# Altium footprint library SomoPowerPackControl.PcbLib: 145 footprints (part 9 of 10)
Each footprint in its own frame and in the unit in brackets; x right, y up, seen from the top. Pads: shape width x height; smd on the part's side, far side on the other; paste and mask are expansions set on the pad; w line width, h text height; cw(c..) or ccw(c..) is an arc to the next point about the centre after c.
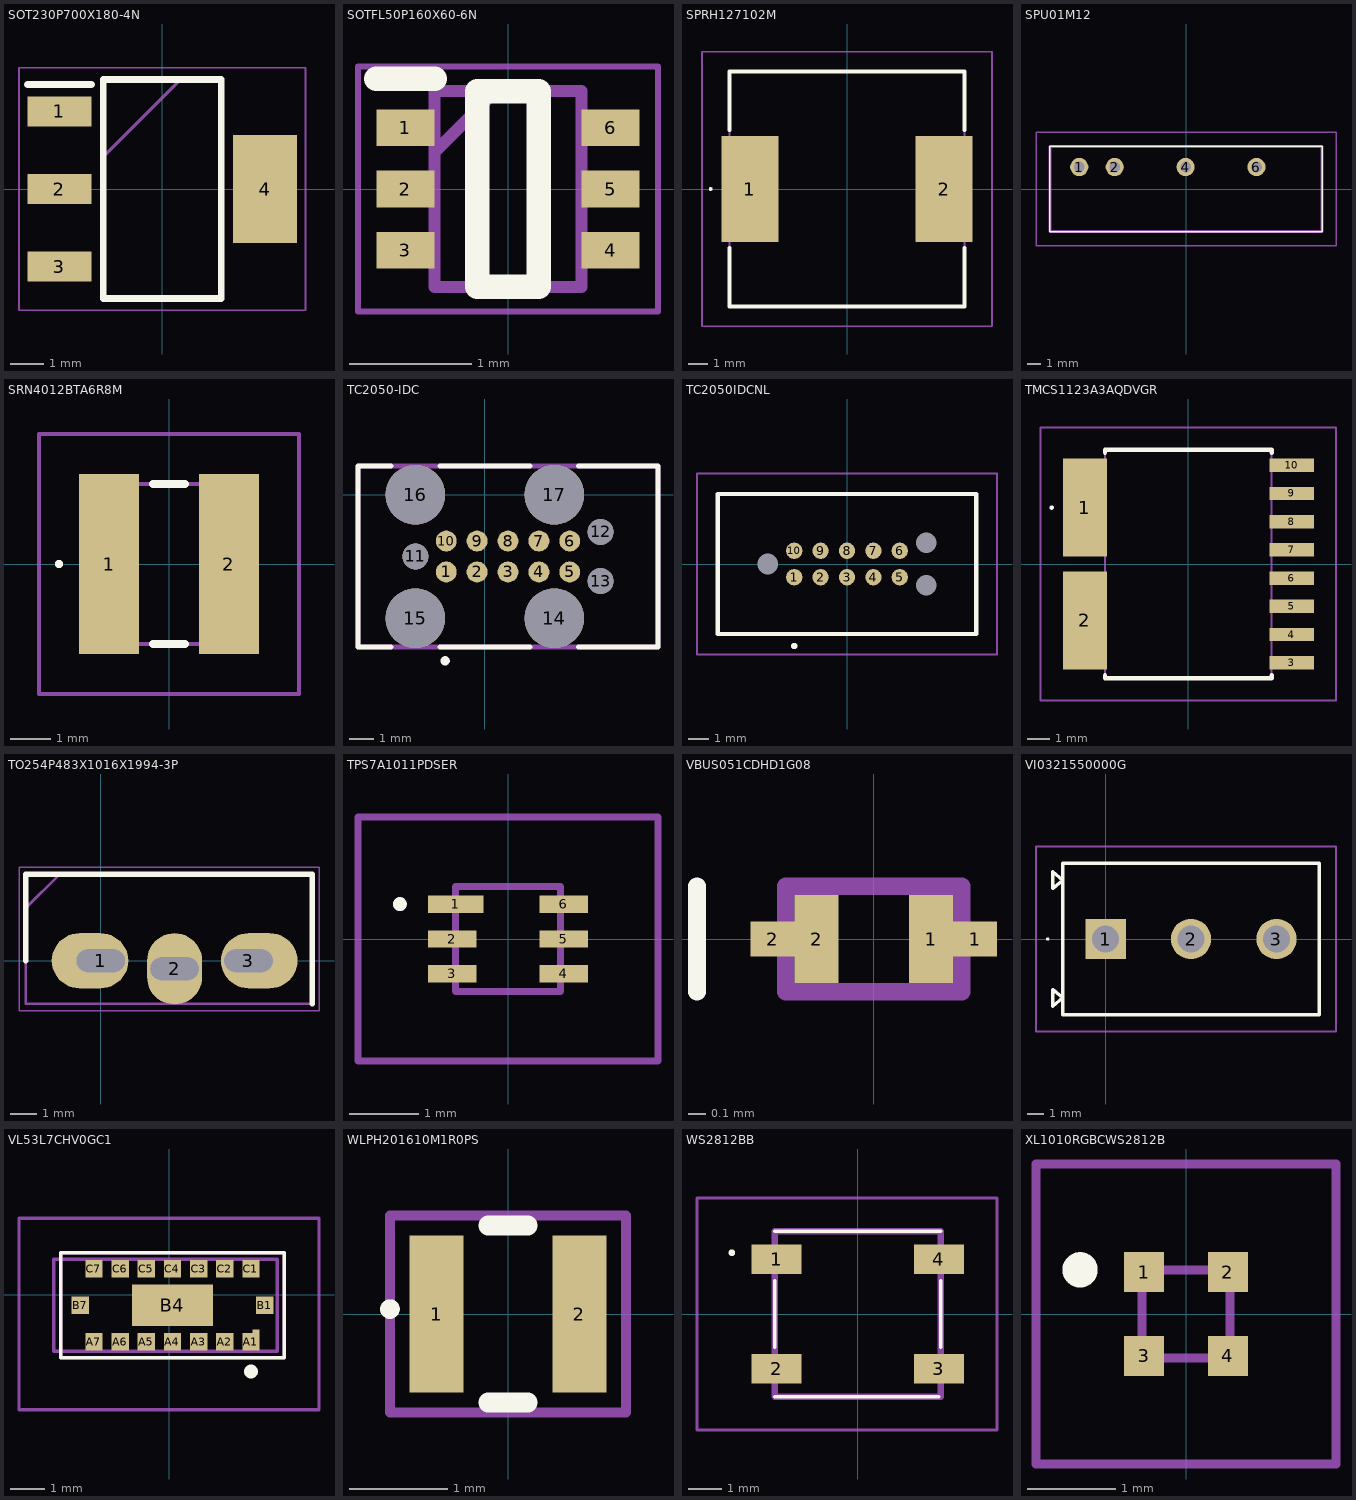
[diagram p8: the footprints below, top view; thin cyan lines are the x and y axes]

## SOT230P700X180-4N [mm]
pads (4):
  rect 1.9x0.9 smd: 1(-3.05,2.3) 2(-3.05,0) 3(-3.05,-2.3)
  rect 1.9x3.2 smd: 4(3.05,0)
Top Overlay:
  lines w0.2: -4,3.1 -2.1,3.1 ; -1.75,-3.25 -1.75,3.25 1.75,3.25 1.75,-3.25 -1.75,-3.25
Mechanical 13:
  lines w0.1: -1.75,0.95 0.55,3.25 ; -1.75,-3.25 -1.75,3.25 1.75,3.25 1.75,-3.25 -1.75,-3.25
Mechanical 15:
  lines w0.05: -4.25,-3.6 -4.25,3.6 4.25,3.6 4.25,-3.6 -4.25,-3.6
3D body "AP2114HA-3.3TRG1.stp": height 1.8, standoff 0, extent -3.5,-3.25 3.5,3.25

## SOTFL50P160X60-6N [mm]
pads (6):
  rect 0.475x0.3 smd: 1(-0.838,0.5) 2(-0.838,0) 3(-0.838,-0.5) 4(0.838,-0.5) 5(0.838,0) 6(0.838,0.5)
Top Overlay:
  lines w0.2: -1.075,0.9 -0.6,0.9 ; -0.25,-0.8 0.25,-0.8 0.25,0.8 -0.25,0.8 -0.25,-0.8
Mechanical 13:
  lines w0.1: -0.6,0.3 -0.1,0.8 ; -0.6,-0.8 0.6,-0.8 0.6,0.8 -0.6,0.8 -0.6,-0.8
Mechanical 15:
  lines w0.05: -1.225,-1 1.225,-1 1.225,1 -1.225,1 -1.225,-1
3D body "2N7002BKV,115.stp": height 0.57, standoff 0, extent -0.802,-0.793 0.798,0.807

## SPRH127102M [mm]
pads (2):
  rect 2.9x5.4 smd: 1(-4.95,0) 2(4.95,0)
Top Overlay:
  lines w0.1: -7,0 ccw(c-6.95,0) -6.9,0 ccw(c-6.95,0) -7,0
  lines w0.2: -6,-3 -6,-6 6,-6 6,-3 ; -6,3 -6,6 6,6 6,3
Mechanical 13:
  lines w0.1: -6,-6 6,-6 6,6 -6,6 -6,-6
Mechanical 15:
  lines w0.1: -7.4,-7 7.4,-7 7.4,7 -7.4,7 -7.4,-7
3D body "SPRH127-102M.stp": height 8.15, standoff 0, extent -6.11,-6 6.11,6

## SPU01M12 [mm]
pads (4):
  round 1.303 hole 0.76: 1(-7.65,1.575) 2(-5.11,1.575) 4(-0.03,1.575) 6(5.05,1.575)
Top Overlay:
  lines w0.1: -9.75,-3.05 9.75,-3.05 9.75,3.05 -9.75,3.05 -9.75,-3.05
Mechanical 13:
  lines w0.2: -9.75,-3.05 9.75,-3.05 9.75,3.05 -9.75,3.05 -9.75,-3.05
Mechanical 15:
  lines w0.1: -10.75,-4.05 10.75,-4.05 10.75,4.05 -10.75,4.05 -10.75,-4.05
3D body "SPU01M-12.stp": height 10.1, standoff -5, extent -9.75,-3.05 9.75,3.05

## SRN4012BTA6R8M [mm]
pads (2):
  rect 1.5x4.5 smd: 1(-1.5,0) 2(1.5,0)
Top Overlay:
  lines w0.1: -2.8,0 ccw(c-2.75,0) -2.7,0 ccw(c-2.75,0) -2.8,0
  lines w0.2: -0.4,-2 0.4,-2 ; -0.4,2 0.4,2
Mechanical 13:
  lines w0.1: -2,-2 2,-2 2,2 -2,2 -2,-2
Mechanical 15:
  lines w0.1: -3.25,-3.25 3.25,-3.25 3.25,3.25 -3.25,3.25 -3.25,-3.25

## TC2050-IDC [mil]
pads (17):
  round 34 smd: 1(-62.5,-125) 2(-12.5,-125) 3(37.5,-125) 4(87.5,-125) 5(137.5,-125) 6(137.5,-75) 7(87.5,-75) 8(37.5,-75) 9(-12.5,-75) 10(-62.5,-75)
  round 42 hole 42 unplated: 11(-112.5,-100) 12(187.5,-60.04) 13(187.5,-139.96)
  round 96.5 hole 96.5 unplated: 14(112.5,-200) 15(-112.5,-200) 16(-112.5,0) 17(112.5,0)
Top Overlay:
  circle w7.87: c-64.35,-268.98 r3.58
  lines w7.87: -151.75,-246.75 -205.41,-246.75 -205.41,46.75 -151.75,46.75 ; -72.93,-246.75 72.93,-246.75 ; -72.93,46.75 72.93,46.75 ; 151.59,-246.75 280.41,-246.75 280.41,46.75 151.59,46.75
Mechanical 13:
  lines w7.87: -205.41,-246.75 -205.41,46.75 280.41,46.75 280.41,-246.75 -205.41,-246.75
3D body "TC2050-IDC-430.stp": height 8190.7, standoff -17.96, extent -304.57,-260.24 379.68,41.65

## TC2050IDCNL [mm]
pads (13):
  round 0.787 smd: 1(-2.54,-0.635) 2(-1.27,-0.635) 3(0,-0.635) 4(1.27,-0.635) 5(2.54,-0.635) 6(2.54,0.635) 7(1.27,0.635) 8(0,0.635) 9(-1.27,0.635) 10(-2.54,0.635)
  round 0.495 hole 0.991 unplated: MH1(-3.81,0) MH2(3.81,-1.015) MH3(3.81,1.015)
Top Overlay:
  lines w0.2: -2.54,-4 ccw(c-2.54,-3.95) -2.54,-3.9 ; -2.54,-4 cw(c-2.54,-3.95) -2.54,-3.9 ; -2.54,-4 ccw(c-2.54,-3.95) -2.54,-3.9 ; -6.223,-3.366 -6.223,3.366 6.223,3.366 6.223,-3.366 -6.223,-3.366
Mechanical 13:
  lines w0.1: -6.223,-3.366 -6.223,3.366 6.223,3.366 6.223,-3.366 -6.223,-3.366
Mechanical 15:
  lines w0.1: -7.223,-4.366 -7.223,4.366 7.223,4.366 7.223,-4.366 -7.223,-4.366

## TMCS1123A3AQDVGR [mm]
pads (10):
  rect 2x4.41 smd: 1(-4.65,2.54) 2(-4.65,-2.54)
  rect 2x0.6 smd: 3(4.65,-4.445) 4(4.65,-3.175) 5(4.65,-1.905) 6(4.65,-0.635) 7(4.65,0.635) 8(4.65,1.905) 9(4.65,3.175) 10(4.65,4.445)
Top Overlay:
  lines w0.1: -6.2,2.54 cw(c-6.15,2.54) -6.1,2.54 cw(c-6.15,2.54) -6.2,2.54
  lines w0.2: -3.75,-5 -3.75,-5.15 3.75,-5.15 3.75,-5 ; -3.75,5 -3.75,5.15 3.75,5.15 3.75,5
Mechanical 13:
  lines w0.1: -3.75,-5.15 -3.75,5.15 3.75,5.15 3.75,-5.15 -3.75,-5.15
Mechanical 15:
  lines w0.1: -6.65,-6.15 -6.65,6.15 6.65,6.15 6.65,-6.15 -6.65,-6.15
3D body "TMCS1123A3AQDVGR.stp": height 2.75, standoff 0, extent -3.75,-5.15 3.75,5.15

## TO254P483X1016X1994-3P [mm]
pads (3):
  oval 2.855x2.055 hole 0.85 slot 1.8 at 0 deg copper offset -0.4,0 mask+0: 1(0,0)
  oval 2.055x2.655 hole 0.85 slot 1.8 at 0 deg mask+0: 2(2.75,-0.3)
  oval 2.855x2.055 hole 0.85 slot 1.8 at 0 deg copper offset 0.4,0 mask+0: 3(5.5,0)
Top Overlay:
  lines w0.2: -2.795,0 -2.795,3.225 7.875,3.225 7.875,-1.605
Mechanical 13:
  lines w0.1: -2.795,1.955 -1.525,3.225 ; -2.795,-1.605 -2.795,3.225 7.875,3.225 7.875,-1.605 -2.795,-1.605
Mechanical 15:
  lines w0.05: -3.045,-1.855 -3.045,3.475 8.125,3.475 8.125,-1.855 -3.045,-1.855
3D body "IRFB4332PBF.stp": height 18.83, standoff -12.41, extent -2.54,-1.283 7.62,2.908

## TPS7A1011PDSER [mm]
pads (6):
  rect 0.8x0.25 smd: 1(-0.75,0.5)
  rect 0.7x0.25 smd: 2(-0.8,0) 3(-0.8,-0.5) 4(0.8,-0.5) 5(0.8,0) 6(0.8,0.5)
Top Overlay:
  lines w0.1: -1.6,0.5 ccw(c-1.55,0.5) -1.5,0.5 ; -1.6,0.5 cw(c-1.55,0.5) -1.5,0.5 ; -1.6,0.5 ccw(c-1.55,0.5) -1.5,0.5
Mechanical 13:
  lines w0.1: -0.75,-0.75 0.75,-0.75 0.75,0.75 -0.75,0.75 -0.75,-0.75
Mechanical 15:
  lines w0.1: -2.15,-1.75 2.15,-1.75 2.15,1.75 -2.15,1.75 -2.15,-1.75
3D body "TPS7A1011PDSER.stp": height 0.9, standoff 0, extent -0.75,-0.75 0.75,0.75

## VBUS051CDHD1G08 [mm]
pads (4):
  rect 0.25x0.5 smd: 1(0.325,0) 2(-0.325,0)
  rect 0.25x0.2 smd: 1(0.575,0) 2(-0.575,0)
Top Overlay:
  lines w0.1: -1.005,-0.3 -1.005,0.3
Mechanical 13:
  lines w0.1: -0.5,-0.3 -0.5,0.3 0.5,0.3 0.5,-0.3 -0.5,-0.3
3D body "VBUS051CD-HD1-G-08.stp": height 0.55, standoff 0, extent -0.68,-0.3 0.68,0.3

## VI0321550000G [mm]
pads (3):
  rect 2.4x2.4 hole 1.6: 1(0,0)
  round 2.4 hole 1.6: 2(5.08,0) 3(10.16,0)
Top Overlay:
  lines w0.1: -3.5,0 cw(c-3.45,0) -3.4,0 cw(c-3.45,0) -3.5,0
  lines w0.2: -3.14,-4 -3.14,-3 -2.54,-3.5 -3.14,-4 ; -3.14,3 -3.14,4 -2.54,3.5 -3.14,3 ; -2.54,-4.5 12.7,-4.5 12.7,4.5 -2.54,4.5 -2.54,-4.5
Mechanical 13:
  lines w0.1: -3.14,-4 -2.54,-3.5 -3.14,-3 -3.14,-4 ; -3.14,3 -3.14,4 -2.54,3.5 -3.14,3 ; -2.54,-4.5 12.7,-4.5 12.7,4.5 -2.54,4.5 -2.54,-4.5
Mechanical 15:
  lines w0.1: -4.14,-5.5 13.7,-5.5 13.7,5.5 -4.14,5.5 -4.14,-5.5
3D body "VI0321550000G.stp": height 13.53, standoff -3.47, extent -3.14,-4.5 12.7,4.5

## VL53L7CHV0GC1 [mm]
pads (18):
  rect 0.5x0.5 smd: A1(2.35,-1.35) A2(1.6,-1.35) A3(0.85,-1.35) A4(0.1,-1.35) A5(-0.65,-1.35) A6(-1.4,-1.35) A7(-2.15,-1.35) B1(2.75,-0.3) B7(-2.55,-0.3) C1(2.35,0.75) C2(1.6,0.75) C3(0.85,0.75) C4(0.1,0.75) C5(-0.65,0.75) C6(-1.4,0.75) C7(-2.15,0.75)
  rect 0.2x0.1 smd: A11(2.5,-1.05)
  rect 2.316x1.2 smd: B4(0.1,-0.3)
Top Overlay:
  lines w0.1: -3.1,-1.8 3.3,-1.8 3.3,1.2 -3.1,1.2 -3.1,-1.8
  lines w0.2: 2.25,-2.2 ccw(c2.35,-2.2) 2.45,-2.2 ccw(c2.35,-2.2) 2.25,-2.2
Mechanical 13:
  lines w0.1: -3.3,-1.615 3.1,-1.615 3.1,1.015 -3.3,1.015 -3.3,-1.615 ; -3.1,-1.8 3.3,-1.8 3.3,1.2 -3.1,1.2 -3.1,-1.8
Mechanical 15:
  lines w0.1: -4.3,-3.3 4.3,-3.3 4.3,2.2 -4.3,2.2 -4.3,-3.3
3D body "VL53L7CHV0GC_1.stp": height 4.6, standoff 0, extent -4.22,-3.183 5.153,2.363

## WLPH201610M1R0PS [mm]
pads (2):
  rect 0.55x1.6 smd: 1(-0.725,0) 2(0.725,0)
Top Overlay:
  lines w0.1: -1.25,0.05 ccw(c-1.2,0.05) -1.15,0.05 ccw(c-1.2,0.05) -1.25,0.05
  lines w0.2: -0.2,-0.9 0.2,-0.9 ; -0.2,0.9 0.2,0.9
Mechanical 13:
  lines w0.1: -1.2,-1 -1.2,1 1.2,1 1.2,-1 -1.2,-1
3D body: height 1, standoff 0, extent -1,-0.8 1,0.8

## WS2812BB [mm]
pads (4):
  rect 1.5x0.9 smd: 1(-2.45,1.65) 2(-2.45,-1.65) 3(2.45,-1.65) 4(2.45,1.65)
Top Overlay:
  lines w0.1: -2.5,-2.5 2.45,-2.5 ; -2.5,-1 -2.5,1 ; -2.5,2.5 2.5,2.5 ; 2.5,-1 2.5,1 ; -3.8,1.8 cw(c-3.8,1.85) -3.8,1.9 cw(c-3.8,1.85) -3.8,1.8
Mechanical 13:
  lines w0.2: -2.5,-2.5 -2.5,2.5 2.5,2.5 2.5,-2.5 -2.5,-2.5
Mechanical 15:
  lines w0.1: -4.85,-3.5 -4.85,3.5 4.2,3.5 4.2,-3.5 -4.85,-3.5
3D body "WS2812B-B.stp": height 2.65, standoff 0, extent -3.2,-2.5 3.2,2.5

## XL1010RGBCWS2812B [mm]
pads (4):
  rect 0.45x0.45 smd: 1(-0.475,0.475) 2(0.475,0.475) 3(-0.475,-0.475) 4(0.475,-0.475)
Top Overlay:
  lines w0.2: -1.2,0.4 ccw(c-1.2,0.5) -1.2,0.6 ccw(c-1.2,0.5) -1.2,0.4
Mechanical 13:
  lines w0.1: -0.5,-0.5 -0.5,0.5 0.5,0.5 0.5,-0.5 -0.5,-0.5
Mechanical 15:
  lines w0.1: -1.7,-1.7 -1.7,1.7 1.7,1.7 1.7,-1.7 -1.7,-1.7
3D body "XL-1010RGBC-WS2812B.stp": height 0.9, standoff 0, extent -0.5,-0.5 0.5,0.5